# Altium footprint library MyPcb.PcbLib: 367 footprints (part 4 of 23)
Each footprint in its own frame and in the unit in brackets; x right, y up, seen from the top. Pads: shape width x height; smd on the part's side, far side on the other; paste and mask are expansions set on the pad; w line width, h text height; cw(c..) or ccw(c..) is an arc to the next point about the centre after c.
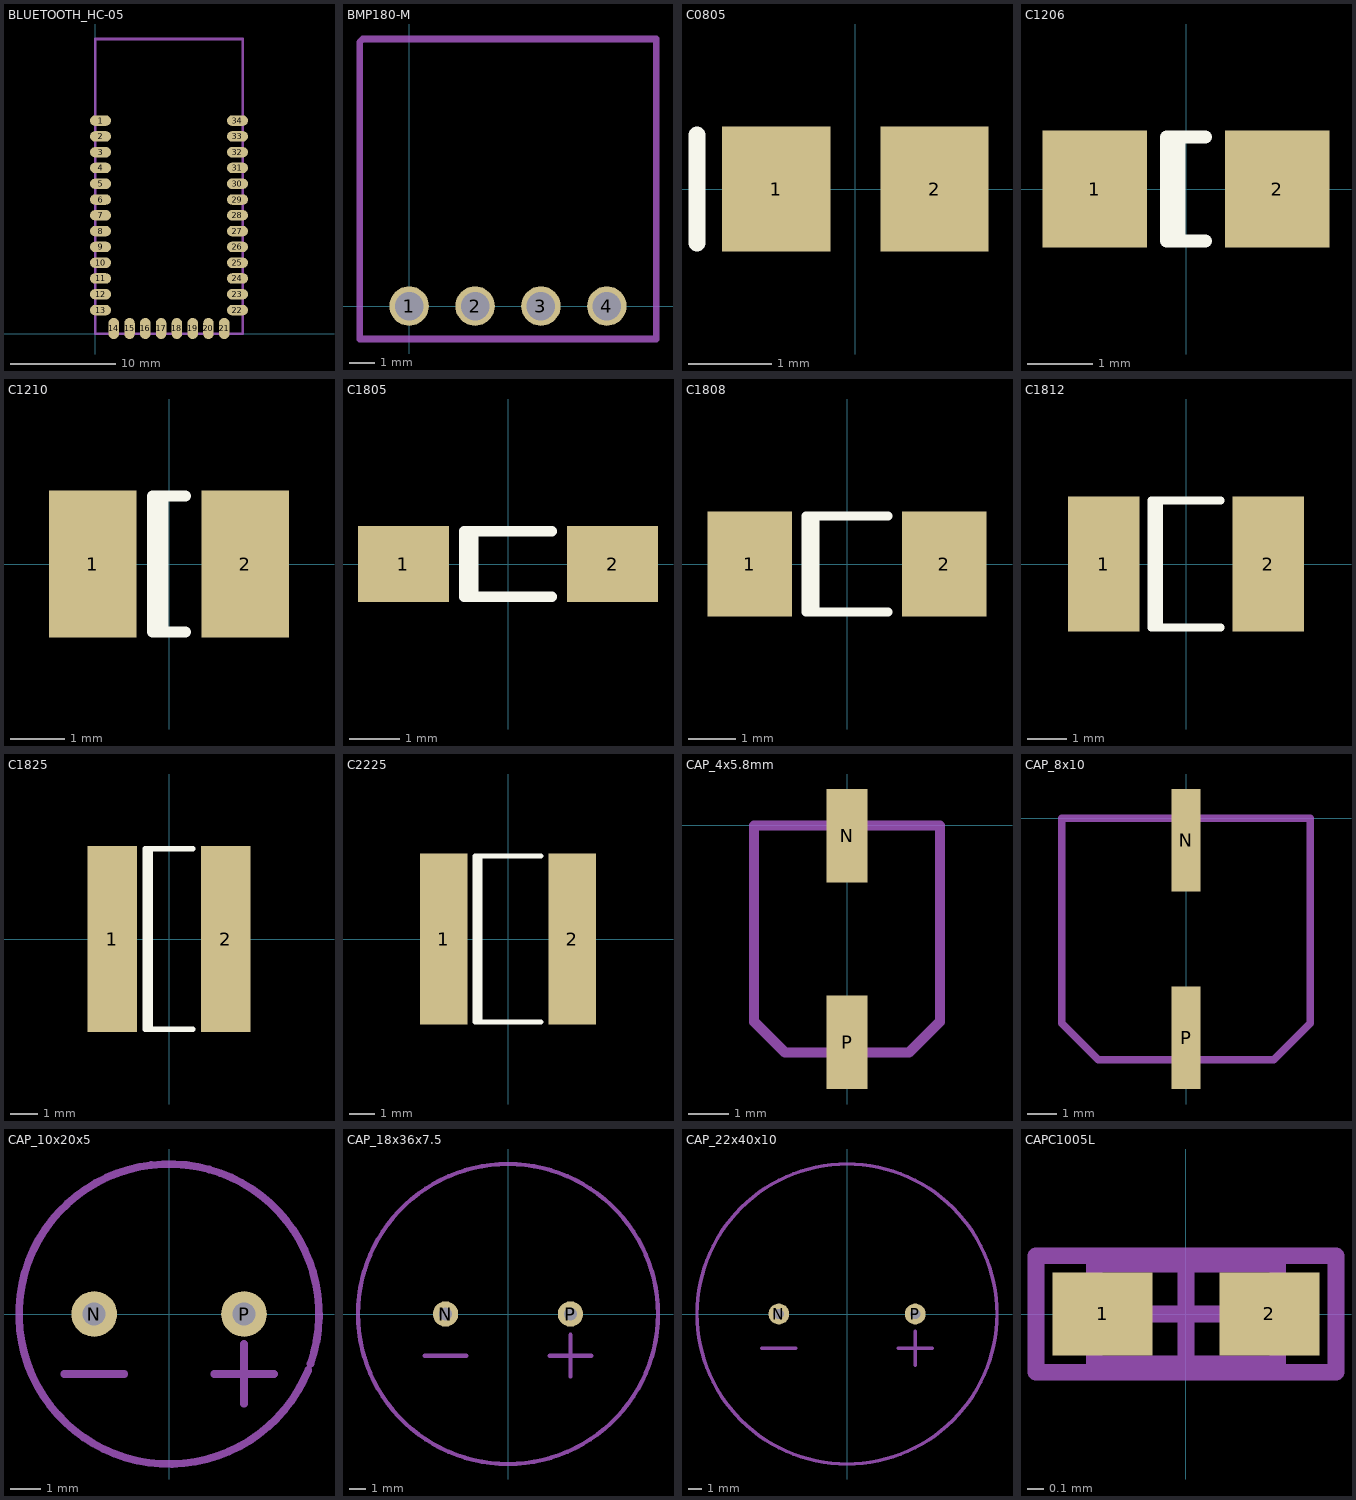
[diagram p3: the footprints below, top view; thin cyan lines are the x and y axes]

## BLUETOOTH_HC-05 [mm]
pads (34):
  oval 2x1 smd: 1(0.5,20.25) 2(0.5,18.75) 3(0.5,17.25) 4(0.5,15.75) 5(0.5,14.25) 6(0.5,12.75) 7(0.5,11.25) 8(0.5,9.75) 9(0.5,8.25) 10(0.5,6.75) 11(0.5,5.25) 12(0.5,3.75) 13(0.5,2.25) 22(13.5,2.25) 23(13.5,3.75) 24(13.5,5.25) 25(13.5,6.75) 26(13.5,8.25) 27(13.5,9.75) 28(13.5,11.25) 29(13.5,12.75) 30(13.5,14.25) 31(13.5,15.75) 32(13.5,17.25) 33(13.5,18.75) 34(13.5,20.25)
  oval 1x2 smd: 14(1.75,0.5) 15(3.25,0.5) 16(4.75,0.5) 17(6.25,0.5) 18(7.75,0.5) 19(9.25,0.5) 20(10.75,0.5) 21(12.25,0.5)
Mechanical 1:
  lines w0.254: 0,0 14,0 14,28 0,28 0,0

## BMP180-M [mil]
pads (4):
  round 60 hole 43.31: 1(0,0) 2(100,0) 3(200,0) 4(300,0)
Mechanical 1:
  lines w10: -75,-50 -75,320 -75,400 -70,405 375,405 375,-50 -75,-50

## C0805 [mm] "Chip Capacitor; Body 2.0 x 1.2 mm (LxW typ)"
height 1.4
pads (2):
  rect 1.3x1.5 smd: 1(-0.95,0) 2(0.95,0)
Top Overlay:
  lines w0.2: -1.9,-0.65 -1.9,0.65

## C1206 [mm] "Chip Capacitor; Body 3.2 x 1.6 mm (LxW typ)"
height 1.3
pads (2):
  rect 1.6x1.8 smd: 1(-1.4,0) 2(1.4,0)
Top Overlay:
  lines w0.2: -0.11,-0.8 -0.11,0.8 ; 0.3,-0.8 -0.3,-0.8 -0.3,0.8 0.3,0.8

## C1210 [mm] "Chip Capacitor; Body 3.2 x 2.5 mm (LxW typ)"
height 1.5
pads (2):
  rect 1.6x2.7 smd: 1(-1.4,0) 2(1.4,0)
Top Overlay:
  lines w0.2: -0.11,-1.25 -0.11,1.25 ; 0.3,-1.25 -0.3,-1.25 -0.3,1.25 0.3,1.25

## C1805 [mm] "Chip Capacitor; Body 4.5 x 1.3 mm (LxW typ)"
height 1.4
pads (2):
  rect 1.8x1.5 smd: 1(-2.075,0) 2(2.075,0)
Top Overlay:
  lines w0.2: -0.685,-0.65 -0.685,0.65 ; 0.875,-0.65 -0.875,-0.65 -0.875,0.65 0.875,0.65

## C1808 [mm] "Chip Capacitor; Body 4.5 x 2.0 mm (LxW typ)"
height 2.03
pads (2):
  rect 1.8x2.25 smd: 1(-2.075,0) 2(2.075,0)
Top Overlay:
  lines w0.2: -0.685,-1.025 -0.685,1.025 ; 0.875,-1.025 -0.875,-1.025 -0.875,1.025 0.875,1.025

## C1812 [mm] "Chip Capacitor; Body 4.5 x 3.2 mm (LxW typ)"
height 2.03
pads (2):
  rect 1.8x3.4 smd: 1(-2.075,0) 2(2.075,0)
Top Overlay:
  lines w0.2: -0.685,-1.6 -0.685,1.6 ; 0.875,-1.6 -0.875,-1.6 -0.875,1.6 0.875,1.6

## C1825 [mm] "Chip Capacitor; Body 4.5 x 6.4 mm (LxW typ)"
height 2.03
pads (2):
  rect 1.8x6.8 smd: 1(-2.075,0) 2(2.075,0)
Top Overlay:
  lines w0.2: -0.685,-3.3 -0.685,3.3 ; 0.875,-3.3 -0.875,-3.3 -0.875,3.3 0.875,3.3

## C2225 [mm] "Chip Capacitor; Body 5.6 x 6.4 mm (LxW typ)"
height 2.03
pads (2):
  rect 1.9x6.8 smd: 1(-2.55,0) 2(2.55,0)
Top Overlay:
  lines w0.2: -1.11,-3.3 -1.11,3.3 ; 1.3,-3.3 -1.3,-3.3 -1.3,3.3 1.3,3.3

## CAP_4x5.8mm [mm]
height 10
pads (2):
  rect 1x2.3 smd: N(0,-0.254) P(0,-5.334)
Mechanical 1:
  lines w0.254: -2.286,-4.826 -2.286,0 2.286,0 2.286,-4.826 1.524,-5.588 -1.524,-5.588 -2.286,-4.826

## CAP_8x10 [mm]
height 10
pads (2):
  rect 1x3.5 smd: N(0,-0.75) P(0,-7.5)
Mechanical 1:
  lines w0.254: -4.25,-7 -4.25,0 4.25,0 4.25,-7 3,-8.25 -3,-8.25 -4.25,-7

## CAP_10x20x5 [mil]
height 787.4
pads (2):
  round 60 hole 30: N(-98.43,0) P(98.43,0)
Mechanical 1:
  lines w10: -137.8,-78.74 -59.06,-78.74 ; 59.06,-78.74 137.8,-78.74 ; 98.43,-118.11 98.43,-39.37 ; 182.78,-73.12 cw(c-0.14,0) 185.63,-65.54

## CAP_18x36x7.5 [mil]
height 1417.32
pads (2):
  round 60 hole 30: N(-147.64,0) P(147.64,0)
Mechanical 1:
  circle w10: c0,0 r354.47
  lines w10: -196.85,-98.43 -98.43,-98.43 ; 98.43,-98.43 196.85,-98.43 ; 147.64,-147.64 147.64,-49.21

## CAP_22x40x10 [mil]
height 1574.8
pads (2):
  round 60 hole 30: N(-196.85,0) P(196.85,0)
Mechanical 1:
  circle w10: c-0.14,0 r432.93
  lines w10: -246.06,-98.43 -147.64,-98.43 ; 147.64,-98.43 246.06,-98.43 ; 196.85,-147.64 196.85,-49.21

## CAPC1005L [mm] "Chip Capacitor, Body 1.0x0.5mm, IPC High Density"
height 0.6
pads (2):
  rect 0.6x0.5 smd: 1(-0.5,0) 2(0.5,0)
Mechanical 13:
  lines w0.1: -0.55,-0.3 0.55,-0.3 0.55,0.3 -0.55,0.3 -0.55,-0.3
Mechanical 15:
  lines w0.1: -0.3,0 0.3,0 ; 0,-0.3 0,0.3 ; -0.9,-0.35 0.9,-0.35 0.9,0.35 -0.9,0.35 -0.9,-0.35
3D body: height 0.6, standoff 0, extent -0.55,-0.3 0.55,0.3